# Altium footprint library TranDangKhoa-LIB.PcbLib: 1435 footprints (part 27 of 90)
Each footprint in its own frame and in the unit in brackets; x right, y up, seen from the top. Pads: shape width x height; smd on the part's side, far side on the other; paste and mask are expansions set on the pad; w line width, h text height; cw(c..) or ccw(c..) is an arc to the next point about the centre after c.
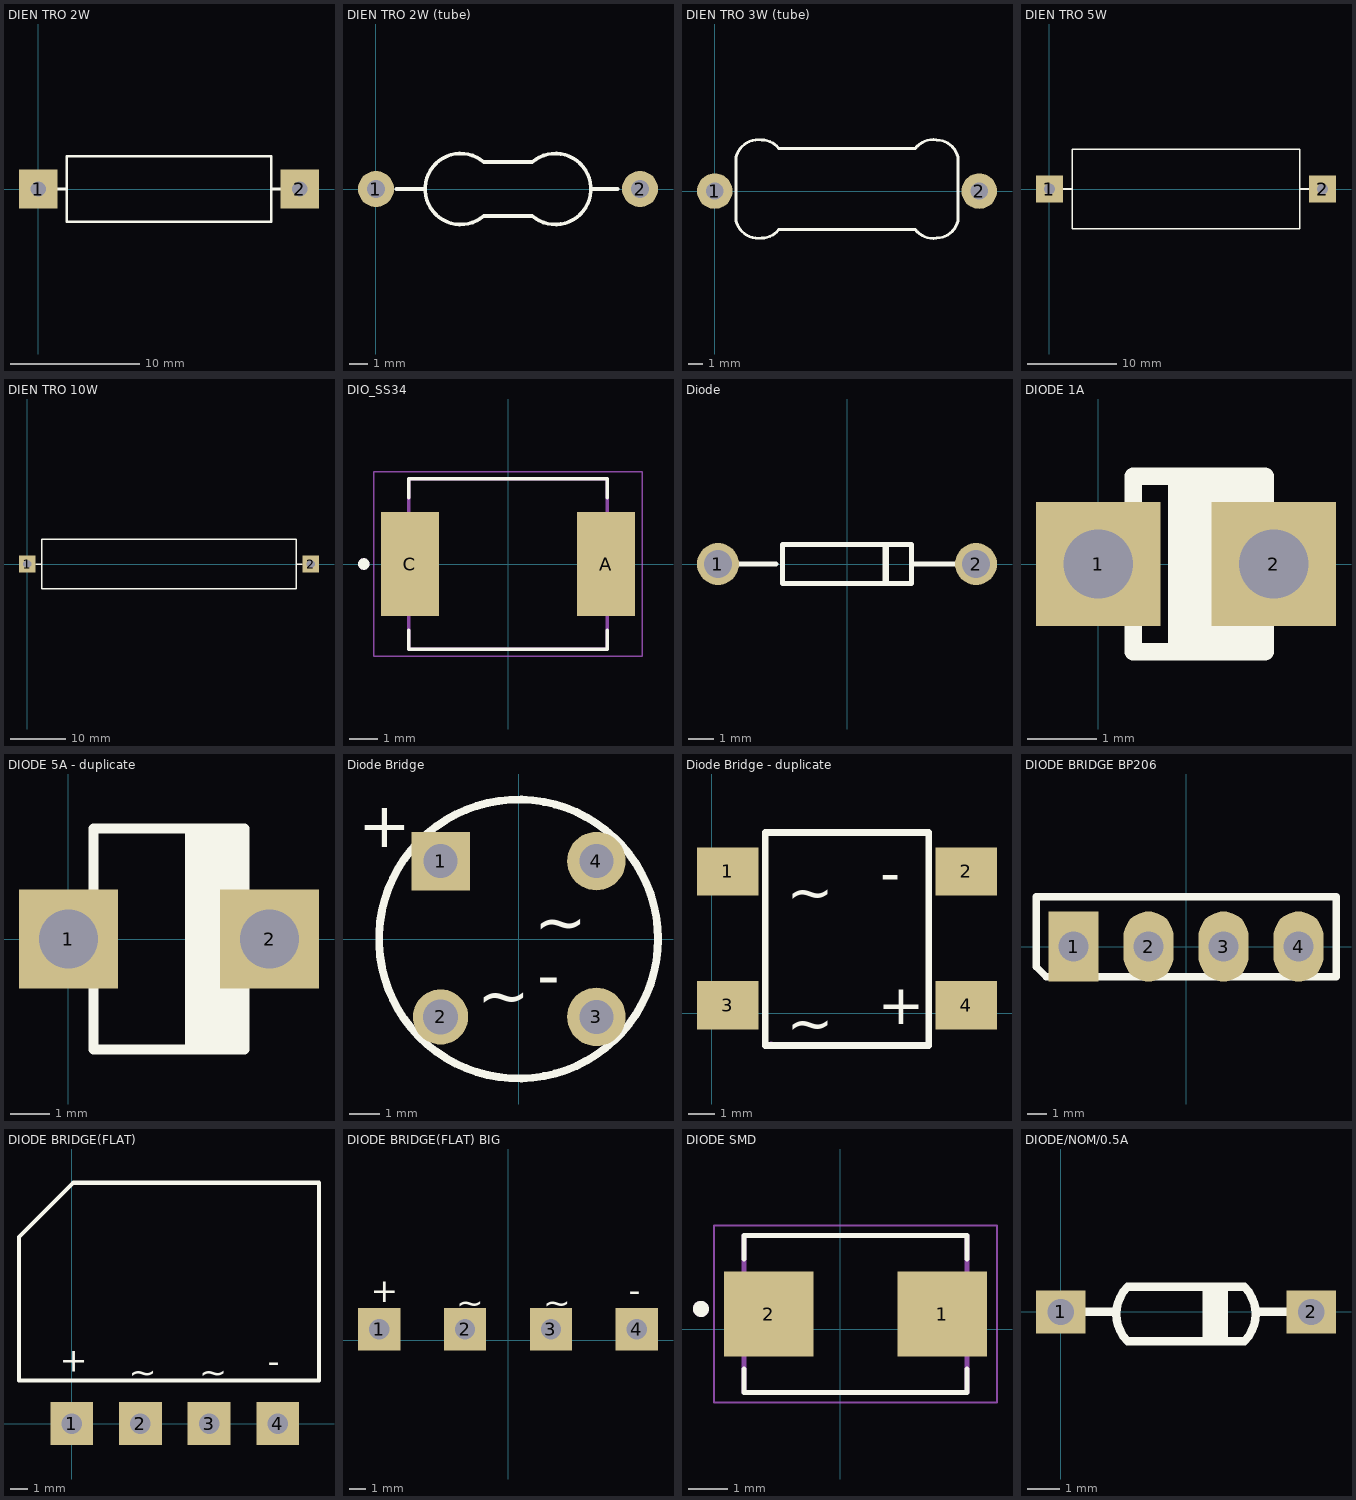
[diagram p26: the footprints below, top view; thin cyan lines are the x and y axes]

## DIEN TRO 2W [mm]
pads (2):
  rect 3x3 hole 1.2: 1(0,0) 2(20.32,0)
Top Overlay:
  lines w0.203: 2.222,-2.54 18.098,-2.54 ; 2.222,-2.54 2.222,2.54 ; 2.222,-2.54 18.098,-2.54 ; 2.222,-2.54 2.222,2.54 ; 2.222,2.54 18.098,2.54 ; 2.222,2.54 18.098,2.54 ; 18.098,-2.54 18.098,2.54 ; 18.098,-2.54 18.098,2.54 ; 1.27,0 2.222,0 1.27,0 ; 18.098,0 19.05,0 18.098,0
3D body: height 5.08, standoff 0, extent 2.222,-2.54 18.098,2.54

## DIEN TRO 2W (tube) [mm] "Dien tro 2W hinh ong"
pads (2):
  round 2 hole 1: 1(0,0) 2(14.707,0)
Top Overlay:
  lines w0.2: 1.143,0 2.701,0 ; 12.006,0 13.462,0
  lines w0.203: 6.003,-1.501 cw(c4.716,0) 6.003,1.501 8.704,1.501 cw(c9.99,0) 8.704,-1.501 6.003,-1.501

## DIEN TRO 3W (tube) [mm] "Dien tro 3W dang ong tru"
pads (2):
  round 2.5 hole 1.2: 1(0,0) 2(18.609,0)
Top Overlay:
  lines w0.2: 3.302,-3.302 cw(c3.062,-1.711) 1.501,-2.101 1.501,2.401 cw(c3.062,2.011) 3.302,3.602 cw(c3.302,2.101) 4.502,3.002 14.107,3.001 cw(c15.357,2.051) 15.607,3.602 cw(c15.586,2.037) 17.108,2.401 17.108,-2.101 cw(c15.586,-1.737) 15.607,-3.302 cw(c15.357,-1.751) 14.107,-2.701 4.502,-2.701 cw(c3.302,-1.801) 3.302,-3.301

## DIEN TRO 5W [mm]
pads (2):
  rect 3x3 hole 1.2: 1(0,0) 2(30.48,0)
Top Overlay:
  lines w0.203: 2.54,-4.445 2.54,4.445 ; 2.54,-4.445 27.94,-4.445 ; 2.54,-4.445 2.54,4.445 ; 2.54,-4.445 27.94,-4.445 ; 2.54,4.445 27.94,4.445 ; 2.54,4.445 27.94,4.445 ; 27.94,-4.445 27.94,4.445 ; 27.94,-4.445 27.94,4.445 ; 1.27,0 2.54,0 1.27,0 ; 27.94,0 29.21,0 27.94,0
3D body: height 7.62, standoff 0, extent 2.54,-4.445 27.94,4.445

## DIEN TRO 10W [mm]
pads (2):
  rect 3x3 hole 1.5: 1(0,0) 2(50.8,0)
Top Overlay:
  lines w0.254: 1.524,0 2.54,0 ; 48.26,0 49.276,0 ; 2.54,-4.445 48.26,-4.445 48.26,4.445 2.54,4.445 2.54,-4.445
3D body: height 7.62, standoff 0, extent 2.54,-4.445 48.26,4.445

## DIO_SS34 [mm]
height 2.65
pads (2):
  rect 2x3.6 smd: A(3.4,0) C(-3.4,0)
Top Overlay:
  circle w0.2: c-5,0 r0.1
  lines w0.127: -3.437,-2.3 -3.437,-2.95 3.437,-2.95 3.437,-2.3 ; -3.437,2.3 -3.437,2.95 3.437,2.95 3.437,2.3
Mechanical 13:
  circle w0.2: c-5,0 r0.1
  lines w0.127: -3.437,-2.95 3.437,-2.95 3.437,2.95 -3.437,2.95 -3.437,-2.95
Mechanical 15:
  lines w0.05: -4.65,-3.2 4.65,-3.2 4.65,3.2 -4.65,3.2 -4.65,-3.2
3D body "step_temp.STEP": height 2.65, standoff 0, extent -3.975,-2.95 3.975,2.95

## Diode [mil] "Diode"
pads (2):
  round 65 hole 43.31: 1(-200,0) 2(200,0)
Top Overlay:
  lines w7.87: -170,0 -110,0 ; 100,0 200,0 ; -100,-30 100,-30 100,30 -100,30 -100,-30
  lines w10: 60,-27 60,27

## DIODE 1A [mm]
pads (2):
  rect 1.8x1.8 hole 1: 1(0,0) 2(2.54,0)
Top Overlay:
  region: 1.016,1.27 1.778,1.27 1.016,1.27 1.778,1.27 2.413,1.27 1.016,1.27 2.413,1.27 2.413,-1.27 1.778,-1.27 1.016,-1.27 1.016,-1.09
  lines w0.254: 0,0 0.508,0 ; 2.54,0 2.921,0 ; 0.508,-1.27 0.508,1.27 2.413,1.27 2.413,-1.27 0.508,-1.27
3D body "User Library-Diod DO-41 Vertical.STEP": height 10.64, standoff -3.5, extent -0.43,-1.365 3.905,1.365

## DIODE 5A - duplicate [mm]
pads (2):
  rect 2.5x2.5 hole 1.5: 1(0,0) 2(5.08,0)
Top Overlay:
  region: 3.048,2.794 4.445,2.794 4.445,-2.794 3.048,-2.794
  lines w0.2: 3.048,-2.794 3.048,2.794
  lines w0.254: 0,0 0.635,0 ; 4.445,0 5.08,0 ; 0.635,-2.794 0.635,2.794 4.445,2.794 4.445,-2.794 0.635,-2.794
3D body "User Library-Diod DO-201AD Vertical.STEP": height 15.19, standoff -3.5, extent -0.66,-2.805 7.885,2.805

## Diode Bridge [mm] "Bridge Rectifier; 4 Terminals; Body 9.4 x 9.4 mm (typ); Pitch 5.08 mm"
height 0.14
pads (4):
  rect 1.905x1.905 hole 1.1: 1(-2.54,2.54)
  round 1.8 hole 1.143: 2(-2.54,-2.54)
  round 1.905 hole 1.1: 3(2.54,-2.54) 4(2.54,2.54)
Top Overlay:
  circle w0.254: c0,0 r4.547
  text "~" at 0.508,-0.178 h1.5
  text "~" at -1.346,-2.565 h1.5
  text "-" at 0.61,-1.905 h1.5
  text "+" at -5.232,2.997 h1.5
3D body "User Library-Silicon Bridge Rectifiers 2W10.STEP": height 12, standoff -6, extent -4.5,-4.55 4.5,4.45

## Diode Bridge - duplicate [mm]
pads (4):
  rect 2.3x1.8 smd: 1(0.6,5.3) 2(9.5,5.3) 3(0.6,0.3) 4(9.5,0.3)
Top Overlay:
  lines w0.254: 2,-1.2 8.1,-1.2 8.1,6.75 2,6.75 2,-1.2
  text "+" at 6.2,-0.4 h1.52
  text "-" at 6.3,4.5 h1.52
  text "~" at 2.8,-1.1 h1.52
  text "~" at 2.8,3.8 h1.52
Mechanical 1:
  lines w0.254: 2.225,-1.175 2.2,-1.2 2.65,-1.2
3D body "diodebridge-SDIP-step.STEP": height 3.63, standoff 0, extent 0.075,-1.525 10.075,6.975

## DIODE BRIDGE BP206 [mil] "DIP; 4 Leads; Row Spacing 7.62 mm; Pitch 2.54 mm"
height 209.84
pads (4):
  rect 100x140 hole 60: 1(-225,0)
  oval 100x140 hole 60: 2(-75,0) 3(75,0) 4(225,0)
Top Overlay:
  lines w15: -300,-40 -280,-60 300,-60 300,100 -300,100 -300,-40

## DIODE BRIDGE(FLAT) [mm]
pads (4):
  rect 2.5x2.5 / inner round 1.575 / far side rect 2.5x2.5 hole 1.2: 1(0,0) 2(4,0) 3(8,0) 4(12,0)
Top Overlay:
  lines w0.254: -3.073,2.515 -3.073,10.871 0.076,14.021 14.402,14.021 14.402,2.515 2.045,2.515 -3.073,2.515
  text "-" at 11.405,2.946 h1.43
  text "+" at -0.686,3.01 h1.43
  text "~" at 7.417,2.299 h1.43
  text "~" at 3.327,2.286 h1.43

## DIODE BRIDGE(FLAT) BIG [mm]
pads (4):
  rect 2.5x2.5 hole 1.2: 1(-7.62,0.66) 2(-2.54,0.66) 3(2.54,0.66) 4(7.62,0.66)
Top Overlay:
  text "-" at 7.137,2.286 h1.43
  text "+" at -8.103,2.261 h1.43
  text "~" at 2.083,1.549 h1.43
  text "~" at -3.073,1.549 h1.43
3D body "User Library-bridge 2.step": height 24.27, standoff -12.36, extent -11.15,-1.78 11.15,1.98

## DIODE SMD [mm] "DIODE SMD, DIODE ĐI ỐT"
height 1.02
pads (2):
  rect 2.25x2.13 smd: 1(2.556,0.381) 2(-1.794,0.381)
Top Overlay:
  circle w0.2: c-3.496,0.508 r0.1
  lines w0.127: -2.414,-1.004 -2.414,-1.589 3.176,-1.589 3.176,-1.004 ; -2.414,1.766 -2.414,2.351 3.176,2.351 3.176,1.766
Mechanical 13:
  circle w0.2: c-3.496,0.508 r0.1
  lines w0.127: -2.414,-1.589 -2.414,2.351 3.176,2.351 3.176,-1.589 -2.414,-1.589
Mechanical 15:
  lines w0.05: -3.169,-1.839 -3.169,2.601 3.931,2.601 3.931,-1.839 -3.169,-1.839
3D body "B330B-13.STEP": height 2.37, standoff 0.2, extent -2.169,-0.973 2.881,1.727

## DIODE/NOM/0.5A [mm]
pads (2):
  rect 1.5x1.3 hole 0.8: 1(0,0) 2(7.62,0)
Top Overlay:
  lines w0.254: 0.635,0 1.651,0 ; 4.445,-0.762 4.445,0.762 ; 4.699,-0.889 4.699,0.762 ; 4.953,-0.889 4.953,0.762 ; 5.969,0 7.112,0 ; 2.032,-0.889 cw(c2.857,-0.064) 2.032,0.762 5.588,0.762 cw(c4.763,-0.064) 5.588,-0.889 2.032,-0.889